# Altium footprint library connectors.PCBLIB: 188 footprints (part 5 of 12)
Each footprint in its own frame and in the unit in brackets; x right, y up, seen from the top. Pads: shape width x height; smd on the part's side, far side on the other; paste and mask are expansions set on the pad; w line width, h text height; cw(c..) or ccw(c..) is an arc to the next point about the centre after c.
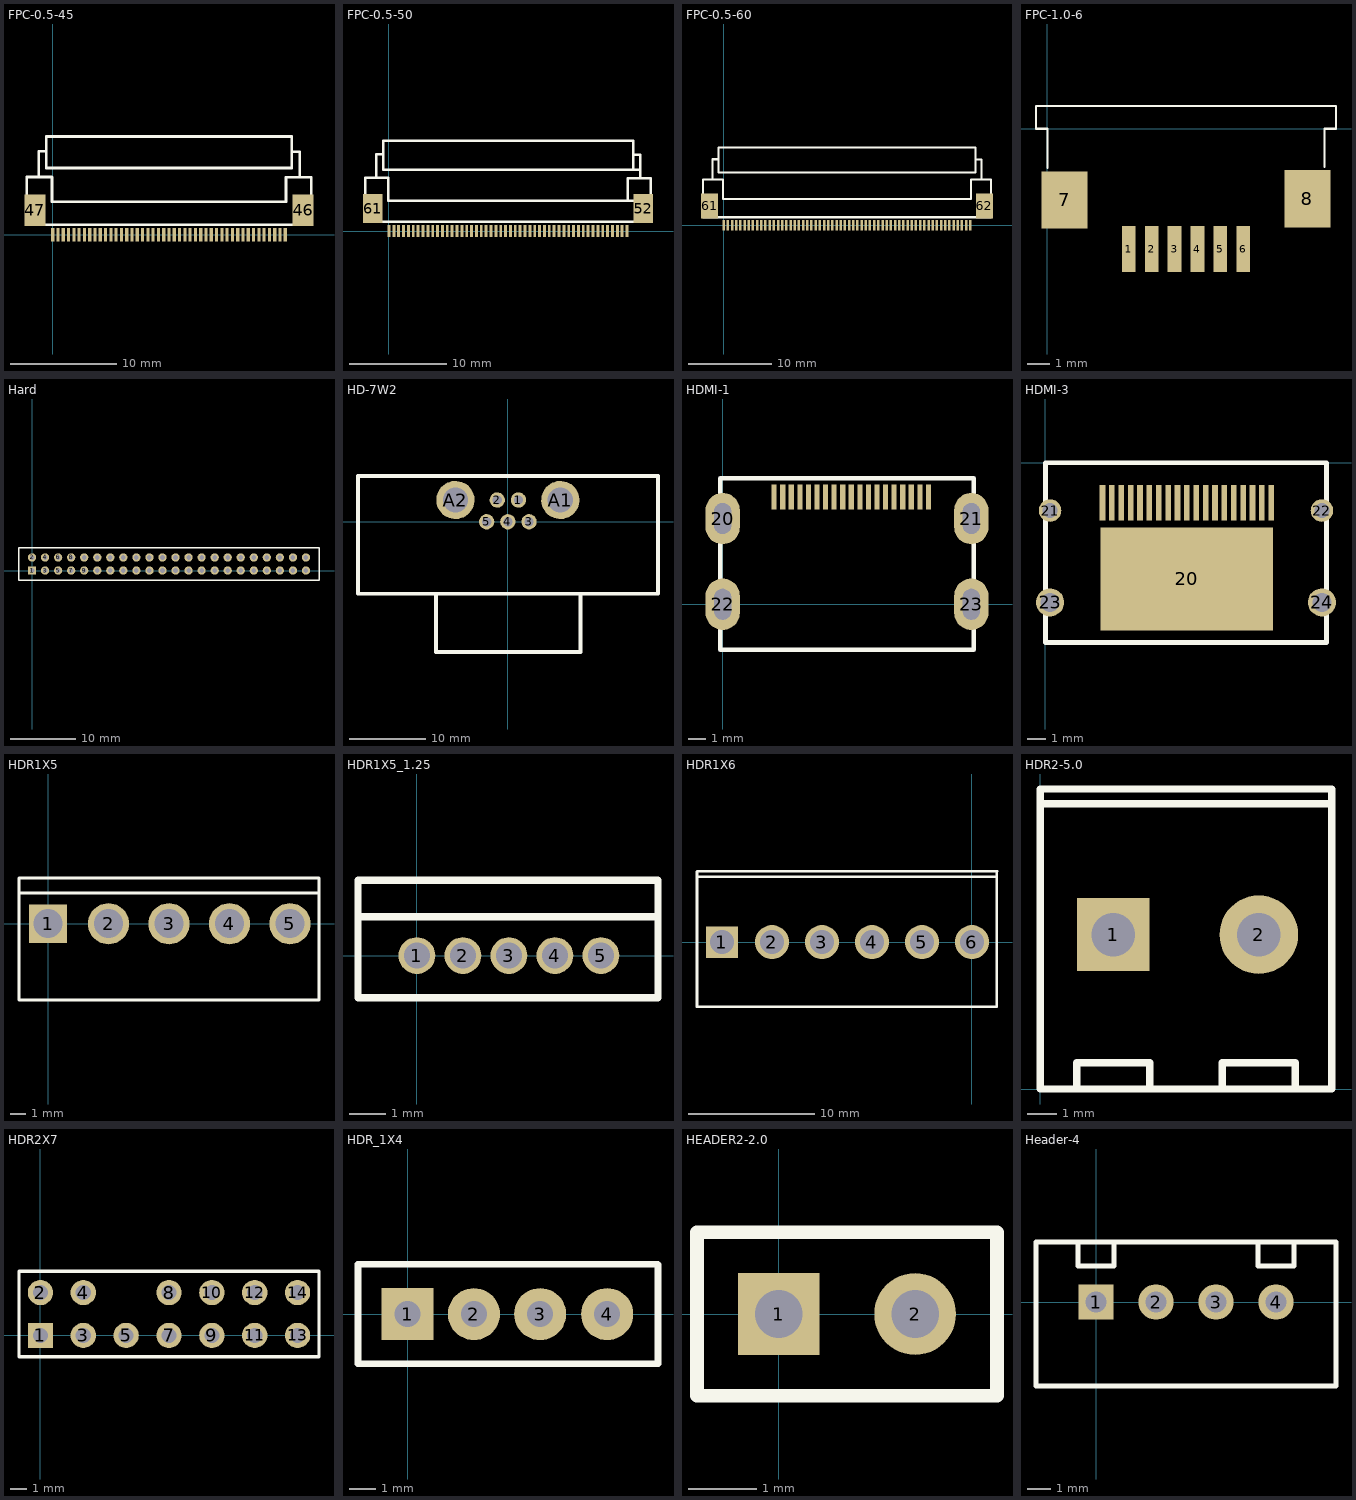
[diagram p4: the footprints below, top view; thin cyan lines are the x and y axes]

## FPC-0.5-45 [mm]
pads (47):
  rect 0.3x1.25 smd: 1(0,0) 2(0.5,0) 3(1,0) 4(1.5,0) 5(2,0) 6(2.5,0) 7(3,0) 8(3.5,0) 9(4,0) 10(4.5,0) 11(5,0) 12(5.5,0) 13(6,0) 14(6.5,0) 15(7,0) 16(7.5,0) 17(8,0) 18(8.5,0) 19(9,0) 20(9.5,0) 21(10,0) 22(10.5,0) 23(11,0) 24(11.5,0) 25(12,0) 26(12.5,0) 27(13,0) 28(13.5,0) 29(14,0) 30(14.5,0) 31(15,0) 32(15.5,0) 33(16,0) 34(16.5,0) 35(17,0) 36(17.5,0) 37(18,0) 38(18.5,0) 39(19,0) 40(19.5,0) 41(20,0) 42(20.5,0) 43(21,0) 44(21.5,0) 45(22,0)
  rect 2x3 smd: 46(23.69,2.325) 47(-1.69,2.325)
Top Overlay:
  lines w0.254: -1.321,5.47 -1.321,7.897 -0.625,7.897 -0.6,7.922 ; 22.621,7.846 22.646,7.871 23.357,7.871 23.357,5.456 ; -2.45,0.962 -2.45,5.162 -2.45,5.47 -0.062,5.47 -0.062,3.135 22.076,3.135 22.076,5.142 22.076,5.442 22.089,5.456 24.45,5.456 24.45,4.263 24.45,0.962 -2.45,0.962 ; -0.6,6.322 -0.6,9.294 22.621,9.294 22.621,6.322 -0.6,6.322

## FPC-0.5-50 [mm]
pads (52):
  rect 0.3x1.25 smd: 1(0,0) 2(0.5,0) 3(1,0) 4(1.5,0) 5(2,0) 6(2.5,0) 7(3,0) 8(3.5,0) 9(4,0) 10(4.5,0) 11(5,0) 12(5.5,0) 13(6,0) 14(6.5,0) 15(7,0) 16(7.5,0) 17(8,0) 18(8.5,0) 19(9,0) 20(9.5,0) 21(10,0) 22(10.5,0) 23(11,0) 24(11.5,0) 25(12,0) 26(12.5,0) 27(13,0) 28(13.5,0) 29(14,0) 30(14.5,0) 31(15,0) 32(15.5,0) 33(16,0) 34(16.5,0) 35(17,0) 36(17.5,0) 37(18,0) 38(18.5,0) 39(19,0) 40(19.5,0) 41(20,0) 42(20.5,0) 43(21,0) 44(21.5,0) 45(22,0) 46(22.5,0) 47(23,0) 48(23.5,0) 49(24,0) 50(24.5,0)
  rect 2x3 smd: 52(26.19,2.325) 61(-1.69,2.325)
Top Overlay:
  lines w0.254: -1.321,5.47 -1.321,7.897 -0.625,7.897 -0.6,7.922 ; 24.576,3.135 24.576,5.142 24.576,5.442 24.589,5.456 26.95,5.456 26.95,4.263 26.95,0.962 -2.45,0.962 -2.45,5.162 -2.45,5.47 -0.062,5.47 -0.062,3.135 26.95,3.135 ; 25.121,6.322 25.121,9.294 -0.6,9.294 -0.6,6.322 25.857,6.322 ; 25.121,7.846 25.146,7.871 25.857,7.871 25.857,5.456

## FPC-0.5-60 [mm]
pads (62):
  rect 0.3x1.25 smd: 1(0,0) 2(0.5,0) 3(1,0) 4(1.5,0) 5(2,0) 6(2.5,0) 7(3,0) 8(3.5,0) 9(4,0) 10(4.5,0) 11(5,0) 12(5.5,0) 13(6,0) 14(6.5,0) 15(7,0) 16(7.5,0) 17(8,0) 18(8.5,0) 19(9,0) 20(9.5,0) 21(10,0) 22(10.5,0) 23(11,0) 24(11.5,0) 25(12,0) 26(12.5,0) 27(13,0) 28(13.5,0) 29(14,0) 30(14.5,0) 31(15,0) 32(15.5,0) 33(16,0) 34(16.5,0) 35(17,0) 36(17.5,0) 37(18,0) 38(18.5,0) 39(19,0) 40(19.5,0) 41(20,0) 42(20.5,0) 43(21,0) 44(21.5,0) 45(22,0) 46(22.5,0) 47(23,0) 48(23.5,0) 49(24,0) 50(24.5,0) 51(25,0) 52(25.5,0) 53(26,0) 54(26.5,0) 55(27,0) 56(27.5,0) 57(28,0) 58(28.5,0) 59(29,0) 60(29.5,0)
  rect 2x3 smd: 61(-1.69,2.325) 62(31.19,2.325)
Top Overlay:
  lines w0.254: -1.321,5.47 -1.321,7.897 -0.625,7.897 -0.6,7.922 ; 30.121,7.846 30.146,7.871 30.857,7.871 30.857,5.456 ; -2.45,0.962 31.95,0.962 31.95,4.263 31.95,5.456 29.589,5.456 29.576,5.442 29.576,5.142 29.576,3.135 -0.062,3.135 -0.062,5.47 -2.45,5.47 -2.45,5.162 -2.45,0.962 ; -0.6,6.322 30.121,6.322 30.121,9.294 -0.6,9.294 -0.6,6.322

## FPC-1.0-6 [mm]
pads (8):
  rect 0.6x2 smd: 1(3.55,-5.25) 2(4.55,-5.25) 3(5.55,-5.25) 4(6.55,-5.25) 5(7.55,-5.25) 6(8.55,-5.25)
  rect 2x2.5 smd: 7(0.75,-3.1) 8(11.35,-3.05)
Top Overlay:
  lines w0.1: 0,-1.7 0,0 -0.5,0 -0.5,1 12.6,1 12.6,0 12.1,0 12.1,-1.65

## Hard [mm]
pads (44):
  rect 1.27x1.27 hole 0.7: 1(0,0)
  round 1.27 hole 0.7: 2(0,2) 3(2,0) 4(2,2) 5(4,0) 6(4,2) 7(6,0) 8(6,2) 9(8,0) 10(8,2) 11(10,0) 12(10,2) 13(12,0) 14(12,2) 15(14,0) 16(14,2) 17(16,0) 18(16,2) 19(18,0) 20(18,2) 21(20,0) 22(20,2) 23(22,0) 24(22,2) 25(24,0) 26(24,2) 27(26,0) 28(26,2) 29(28,0) 30(28,2) 31(30,0) 32(30,2) 33(32,0) 34(32,2) 35(34,0) 36(34,2) 37(36,0) 38(36,2) 39(38,0) 40(38,2) 41(40,0) 42(40,2) 43(42,0) 44(42,2)
Top Overlay:
  lines w0.2: -2,-1.5 44,-1.5 44,3.5 -2,3.5 -2,-1.5

## HD-7W2 [mm]
pads (7):
  round 2 hole 1.2: 1(1.385,2.84) 2(-1.385,2.84) 3(2.77,0) 4(0,0) 5(-2.77,0)
  round 5 hole 3.3: A1(6.85,2.84) A2(-6.85,2.84)
Top Overlay:
  lines w0.508: -9.4,-9.4 -9.4,-17 9.5,-17 9.5,-9.4 ; -19.57,-9.4 19.57,-9.4 19.6,-9.37 19.6,5.97 -19.57,5.97 -19.57,-9.4

## HDMI-1 [mm]
pads (23):
  rect 0.3x1.45 smd: 1(3,6.25) 2(3.5,6.25) 3(4,6.25) 4(4.5,6.25) 5(5,6.25) 6(5.5,6.25) 7(6,6.25) 8(6.5,6.25) 9(7,6.25) 10(7.5,6.25) 11(8,6.25) 12(8.5,6.25) 13(9,6.25) 14(9.5,6.25) 15(10,6.25) 16(10.5,6.25) 17(11,6.25) 18(11.5,6.25) 19(12,6.25)
  oval 2x3 hole 1 slot 1.8 at 90 deg: 20(0,5) 21(14.5,5) 22(0,0) 23(14.5,0)
Top Overlay:
  lines w0.254: -0.15,-2.65 -0.15,7.35 14.55,7.35 14.65,7.35 14.65,-2.65 -0.15,-2.65

## HDMI-3 [mm]
pads (24):
  rect 0.3x1.9 smd: 1(3.05,-2.131) 2(3.55,-2.131) 3(4.05,-2.131) 4(4.55,-2.131) 5(5.05,-2.131) 6(5.55,-2.131) 7(6.05,-2.131) 8(6.55,-2.131) 9(7.05,-2.131) 10(7.55,-2.131) 11(8.05,-2.131) 12(8.55,-2.131) 13(9.05,-2.131) 14(9.55,-2.131) 15(10.05,-2.131) 16(10.55,-2.131) 17(11.05,-2.131) 18(11.55,-2.131) 19(12.05,-2.131)
  rect 9.2x5.5 smd: 20(7.55,-6.195)
  round 1.2 hole 0.8: 21(0.25,-2.545) 22(14.75,-2.545)
  round 1.5 hole 1: 23(0.25,-7.445) 24(14.75,-7.445)
Top Overlay:
  lines w0.254: 0,-9.59 0,0 15,0 15,-9.59 0,-9.59

## HDR1X5 [mm]
pads (5):
  rect 2.5x2.5 hole 1.9: 1(0,0)
  round 2.7 hole 1.9: 2(3.96,0) 3(7.92,0) 4(11.88,0) 5(15.84,0)
Top Overlay:
  lines w0.2: -1.905,2 17.745,2 ; -1.905,-5 17.745,-5 17.745,3 -1.905,3 -1.905,-5

## HDR1X5_1.25 [mm]
pads (5):
  round 1 hole 0.7: 1(0,0) 2(1.25,0) 3(2.5,0) 4(3.75,0) 5(5,0)
Top Overlay:
  lines w0.2: -1.6,1 -1.6,2.05 6.5,2.05 ; 6.55,1.05 -1.6,1.05 -1.6,0.7 -1.6,-1.15 6.55,-1.15 6.55,2.05

## HDR1X6 [mm] "Connector; Header; 4 Position"
height 6.86
pads (6):
  rect 2.5x2.5 hole 1.9: 1(-19.8,0)
  round 2.7 hole 1.9: 2(-15.84,0) 3(-11.88,0) 4(-7.92,0) 5(-3.96,0) 6(0,0)
Top Overlay:
  lines w0.2: -21.78,5.182 1.98,5.182 ; -21.78,5.588 -21.78,-5.131 1.98,-5.131 1.98,5.613 ; -21.756,5.6 1.981,5.6

## HDR2-5.0 [mm]
height 0.7
pads (2):
  rect 2.5x2.5 hole 1.5: 1(2.5,5.3)
  round 2.7 hole 1.5: 2(7.5,5.3)
Top Overlay:
  lines w0.254: 0.024,9.8 10,9.8 ; 1.25,0 1.25,0.9 3.75,0.9 3.75,0 ; 6.25,0 6.25,0.9 8.75,0.9 8.75,0 ; 0,0 10,0 10,10.3 0,10.3 0,0

## HDR2X7 [mm] "Connector; Header; 7x2 Position"
pads (13):
  rect 1.5x1.5 hole 0.9: 1(0,0)
  round 1.5 hole 0.9: 2(0,2.54) 3(2.54,0) 4(2.54,2.54) 5(5.08,0) 7(7.62,0) 8(7.62,2.54) 9(10.16,0) 10(10.16,2.54) 11(12.7,0) 12(12.7,2.54) 13(15.24,0) 14(15.24,2.54)
Top Overlay:
  lines w0.2: -1.27,-1.27 16.51,-1.27 16.51,3.81 -1.27,3.81 -1.27,-1.27

## HDR_1X4 [mm] "Connector; Header; 4 Position"
height 6.86
pads (4):
  rect 2x2 hole 1: 1(0,0)
  round 2 hole 1: 2(2.54,0) 3(5.08,0) 4(7.65,0)
Top Overlay:
  lines w0.254: -1.905,-1.9 9.6,-1.9 9.6,1.9 9.592,1.908 -1.905,1.908 -1.905,-1.9
3D body: height 8.38, standoff -3.81, extent -1.28,-1.44 8.88,1.1

## HEADER2-2.0 [mm]
pads (2):
  rect 1.2x1.2 hole 0.7: 1(0,0)
  round 1.2 hole 0.7: 2(2,0)
Top Overlay:
  lines w0.2: -1.2,-1.2 -1.2,1.2 3.2,1.2 3.2,-1.2 -1.2,-1.2

## Header-4 [mm]
pads (4):
  rect 1.5x1.5 hole 0.9: 1(0,0)
  round 1.5 hole 0.9: 2(2.54,0) 3(5.08,0) 4(7.62,0)
Top Overlay:
  lines w0.2: -0.762,2.54 -0.762,1.524 0.762,1.524 0.762,2.54 ; 6.858,2.54 6.858,1.524 8.382,1.524 8.382,2.54 ; -2.54,-3.556 10.16,-3.556 10.16,2.54 -2.54,2.54 -2.54,-3.556